# Altium footprint library ST封装.PcbLib: 1336 footprints (part 64 of 109)
Each footprint in its own frame and in the unit in brackets; x right, y up, seen from the top. Pads: shape width x height; smd on the part's side, far side on the other; paste and mask are expansions set on the pad; w line width, h text height; cw(c..) or ccw(c..) is an arc to the next point about the centre after c.
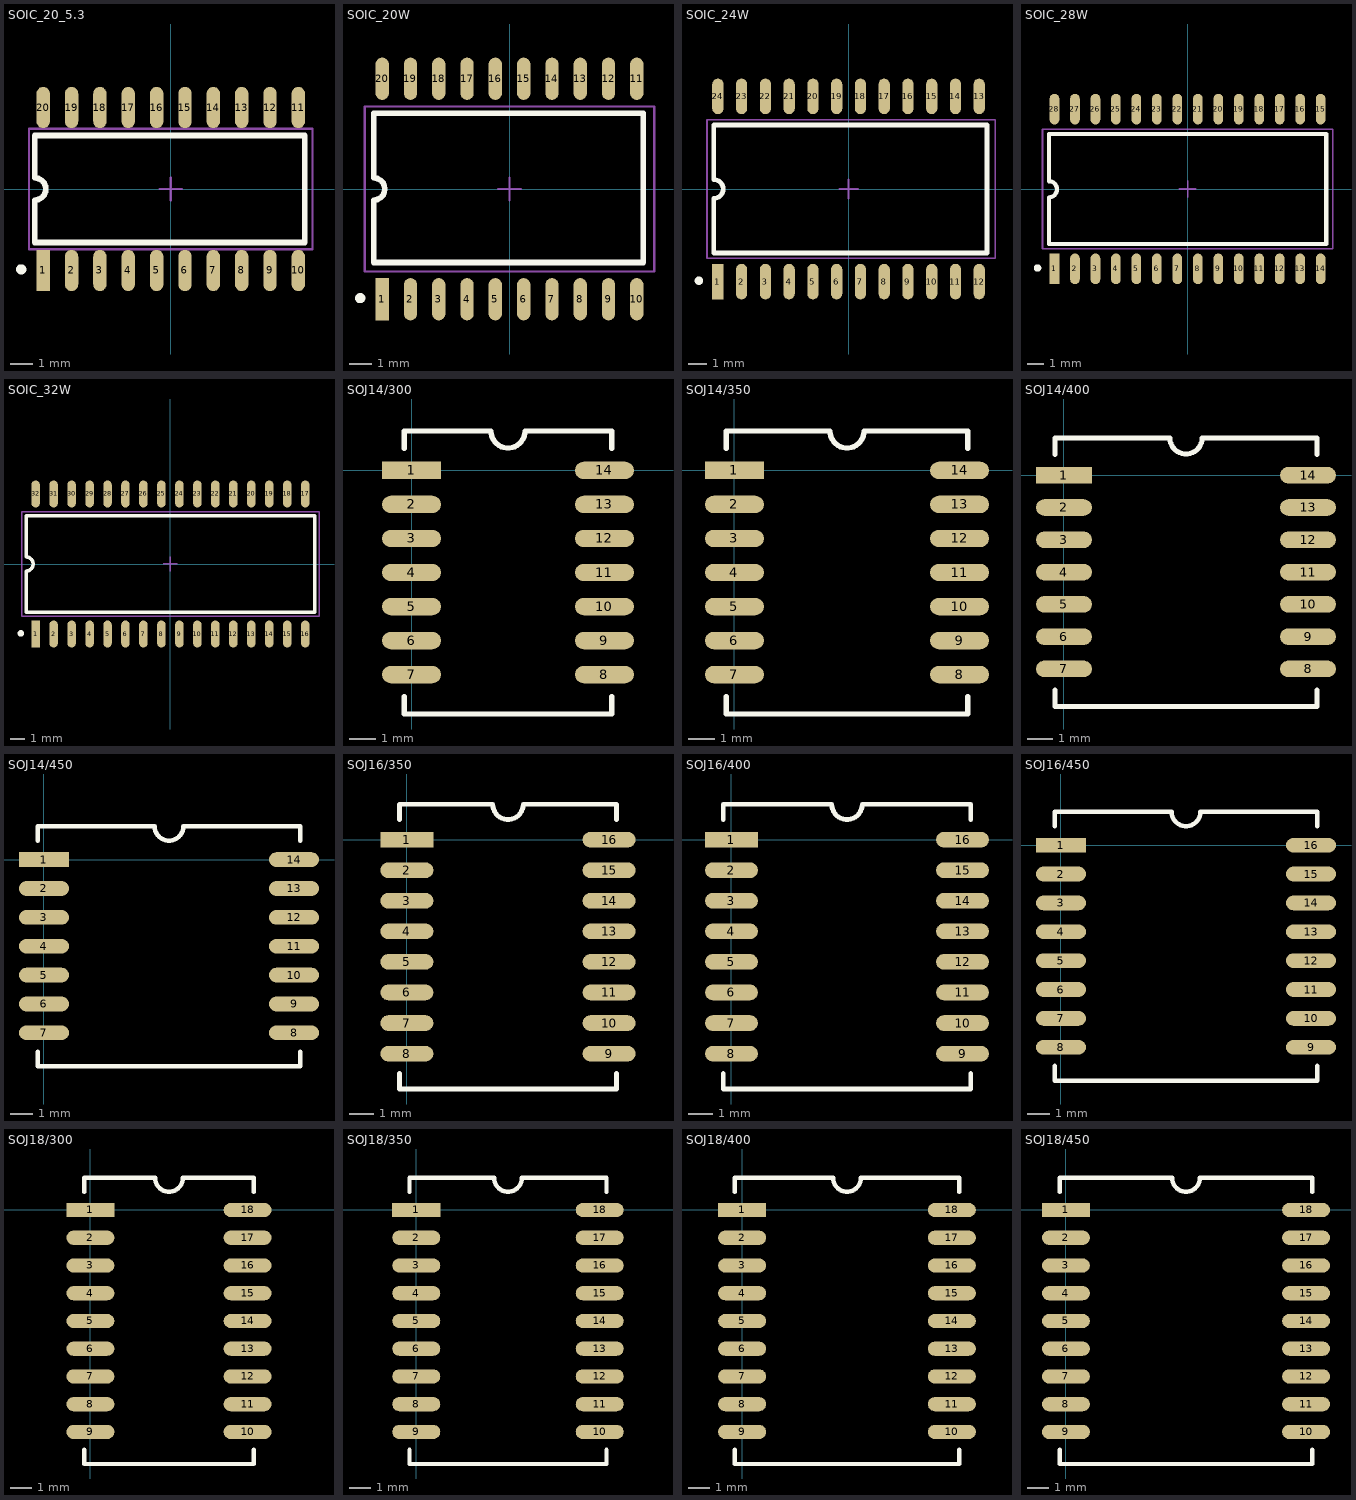
[diagram p63: the footprints below, top view; thin cyan lines are the x and y axes]

## SOIC_20_5.3 [mm]
pads (20):
  rect 0.6x1.85 smd: 1(-5.715,-3.65)
  oval 0.6x1.85 smd: 2(-4.445,-3.65) 3(-3.175,-3.65) 4(-1.905,-3.65) 5(-0.635,-3.65) 6(0.635,-3.65) 7(1.905,-3.65) 8(3.175,-3.65) 9(4.445,-3.65) 10(5.715,-3.65) 11(5.715,3.65) 12(4.445,3.65) 13(3.175,3.65) 14(1.905,3.65) 15(0.635,3.65) 16(-0.635,3.65) 17(-1.905,3.65) 18(-3.175,3.65) 19(-4.445,3.65) 20(-5.715,3.65)
Top Overlay:
  circle w0.254: c-6.7,-3.6 r0.1
  lines w0.254: -6.1,-2.4 -6.1,-0.5 ccw(c-6.1,0) -6.1,0.5 -6.1,2.4 6,2.4 6,-2.4 -6.1,-2.4
Mechanical 15:
  lines w0.1: -0.5,0 0.5,0 ; 0,-0.5 0,0.5 ; -6.35,-2.7 6.35,-2.7 6.35,2.7 -6.35,2.7 -6.35,-2.7
3D body "SOP-20.STEP": height 2, standoff 0, extent -6.35,-4.05 6.35,4.05

## SOIC_20W [mm] "7.4"
pads (20):
  rect 0.6x1.9 smd: 1(-5.715,-4.95)
  oval 0.6x1.9 smd: 2(-4.445,-4.95) 3(-3.175,-4.95) 4(-1.905,-4.95) 5(-0.635,-4.95) 6(0.635,-4.95) 7(1.905,-4.95) 8(3.175,-4.95) 9(4.445,-4.95) 10(5.715,-4.95) 11(5.715,4.95) 12(4.445,4.95) 13(3.175,4.95) 14(1.905,4.95) 15(0.635,4.95) 16(-0.635,4.95) 17(-1.905,4.95) 18(-3.175,4.95) 19(-4.445,4.95) 20(-5.715,4.95)
Top Overlay:
  circle w0.254: c-6.7,-4.9 r0.1
  lines w0.254: -6.1,-3.3 6,-3.3 6,3.4 -6.1,3.4 -6.1,0.5 cw(c-6.1,0) -6.1,-0.5 -6.1,-3.3
Mechanical 15:
  lines w0.1: -0.5,0 0.5,0 ; 0,-0.5 0,0.5 ; -6.5,-3.7 -6.5,3.7 6.5,3.7 6.5,-3.7 -6.5,-3.7
3D body "SOP-20L.STEP": height 2.8, standoff 0, extent -6.518,-5.152 6.482,5.184

## SOIC_24W [mm] "7.4"
pads (24):
  rect 0.6x1.9 smd: 1(-6.985,-4.95)
  oval 0.6x1.9 smd: 2(-5.715,-4.95) 3(-4.445,-4.95) 4(-3.175,-4.95) 5(-1.905,-4.95) 6(-0.635,-4.95) 7(0.635,-4.95) 8(1.905,-4.95) 9(3.175,-4.95) 10(4.445,-4.95) 11(5.715,-4.95) 12(6.985,-4.95) 13(6.985,4.95) 14(5.715,4.95) 15(4.445,4.95) 16(3.175,4.95) 17(1.905,4.95) 18(0.635,4.95) 19(-0.635,4.95) 20(-1.905,4.95) 21(-3.175,4.95) 22(-4.445,4.95) 23(-5.715,4.95) 24(-6.985,4.95)
Top Overlay:
  circle w0.254: c-8,-4.9 r0.1
  lines w0.254: -7.2,-3.425 7.4,-3.425 7.4,3.425 -7.2,3.425 -7.2,0.5 cw(c-7.2,0) -7.2,-0.5 -7.2,-3.425
Mechanical 15:
  lines w0.1: -0.5,0 0.5,0 ; 0,-0.5 0,0.5 ; -7.56,-3.7 7.84,-3.7 7.84,3.7 -7.56,3.7 -7.56,-3.7
3D body "SOIC24.STEP": height 2.6, standoff 0, extent -7.56,-5.2 7.84,5.2

## SOIC_28W [mm] "7.4"
pads (28):
  rect 0.6x1.9 smd: 1(-8.255,-4.95)
  oval 0.6x1.9 smd: 2(-6.985,-4.95) 3(-5.715,-4.95) 4(-4.445,-4.95) 5(-3.175,-4.95) 6(-1.905,-4.95) 7(-0.635,-4.95) 8(0.635,-4.95) 9(1.905,-4.95) 10(3.175,-4.95) 11(4.445,-4.95) 12(5.715,-4.95) 13(6.985,-4.95) 14(8.255,-4.95) 15(8.255,4.95) 16(6.985,4.95) 17(5.715,4.95) 18(4.445,4.95) 19(3.175,4.95) 20(1.905,4.95) 21(0.635,4.95) 22(-0.635,4.95) 23(-1.905,4.95) 24(-3.175,4.95) 25(-4.445,4.95) 26(-5.715,4.95) 27(-6.985,4.95) 28(-8.255,4.95)
Top Overlay:
  circle w0.254: c-9.3,-4.9 r0.1
  lines w0.254: -8.6,0.483 cw(c-8.6,-0.018) -8.6,-0.518 -8.6,-3.4 8.6,-3.4 8.6,3.4 -8.6,3.4 -8.6,0.5
Mechanical 15:
  lines w0.1: -0.5,0 0.5,0 ; 0,-0.5 0,0.5 ; -9,-3.7 -9,3.7 9,3.7 9,-3.7 -9,-3.7
3D body "SOIC28.STEP": height 2.65, standoff 0, extent -8.95,-5.15 8.95,5.15

## SOIC_32W [mm] "7.4"
pads (32):
  rect 0.6x1.9 smd: 1(-9.525,-4.95)
  oval 0.6x1.9 smd: 2(-8.255,-4.95) 3(-6.985,-4.95) 4(-5.715,-4.95) 5(-4.445,-4.95) 6(-3.175,-4.95) 7(-1.905,-4.95) 8(-0.635,-4.95) 9(0.635,-4.95) 10(1.905,-4.95) 11(3.175,-4.95) 12(4.445,-4.95) 13(5.715,-4.95) 14(6.985,-4.95) 15(8.255,-4.95) 16(9.525,-4.95) 17(9.525,4.95) 18(8.255,4.95) 19(6.985,4.95) 20(5.715,4.95) 21(4.445,4.95) 22(3.175,4.95) 23(1.905,4.95) 24(0.635,4.95) 25(-0.635,4.95) 26(-1.905,4.95) 27(-3.175,4.95) 28(-4.445,4.95) 29(-5.715,4.95) 30(-6.985,4.95) 31(-8.255,4.95) 32(-9.525,4.95)
Top Overlay:
  circle w0.254: c-10.57,-4.9 r0.1
  lines w0.254: -10.2,-3.4 -10.2,-0.501 ccw(c-10.2,0) -10.2,0.5 -10.2,3.4 10.2,3.4 10.2,-3.4 -10.2,-3.4
Mechanical 15:
  lines w0.1: -0.5,0 0.5,0 ; 0,-0.5 0,0.5 ; -10.5,-3.7 -10.5,3.7 10.5,3.7 10.5,-3.7 -10.5,-3.7

## SOJ14/300 [mm]
pads (14):
  rect 2.2x0.65 smd: 1(0,0)
  oval 2.2x0.65 smd: 2(0,-1.27) 3(0,-2.54) 4(0,-3.81) 5(0,-5.08) 6(0,-6.35) 7(0,-7.62) 8(7.2,-7.62) 9(7.2,-6.35) 10(7.2,-5.08) 11(7.2,-3.81) 12(7.2,-2.54) 13(7.2,-1.27) 14(7.2,0)
Top Overlay:
  lines w0.2: -0.275,-8.445 -0.275,-9.09 7.475,-9.09 7.475,-8.445 ; -0.275,0.825 -0.275,1.47 2.965,1.47 ccw(c3.6,1.47) 4.235,1.47 7.475,1.47 7.475,0.825

## SOJ14/350 [mm]
pads (14):
  rect 2.2x0.65 smd: 1(0,0)
  oval 2.2x0.65 smd: 2(0,-1.27) 3(0,-2.54) 4(0,-3.81) 5(0,-5.08) 6(0,-6.35) 7(0,-7.62) 8(8.4,-7.62) 9(8.4,-6.35) 10(8.4,-5.08) 11(8.4,-3.81) 12(8.4,-2.54) 13(8.4,-1.27) 14(8.4,0)
Top Overlay:
  lines w0.2: -0.31,-8.445 -0.31,-9.09 8.71,-9.09 8.71,-8.445 ; -0.31,0.825 -0.31,1.47 3.565,1.47 ccw(c4.2,1.47) 4.835,1.47 8.71,1.47 8.71,0.825

## SOJ14/400 [mm]
pads (14):
  rect 2.2x0.65 smd: 1(0,0)
  oval 2.2x0.65 smd: 2(0,-1.27) 3(0,-2.54) 4(0,-3.81) 5(0,-5.08) 6(0,-6.35) 7(0,-7.62) 8(9.6,-7.62) 9(9.6,-6.35) 10(9.6,-5.08) 11(9.6,-3.81) 12(9.6,-2.54) 13(9.6,-1.27) 14(9.6,0)
Top Overlay:
  lines w0.2: -0.345,-8.445 -0.345,-9.09 9.945,-9.09 9.945,-8.445 ; -0.345,0.825 -0.345,1.47 4.165,1.47 ccw(c4.8,1.47) 5.435,1.47 9.945,1.47 9.945,0.825

## SOJ14/450 [mm]
pads (14):
  rect 2.2x0.65 smd: 1(0,0)
  oval 2.2x0.65 smd: 2(0,-1.27) 3(0,-2.54) 4(0,-3.81) 5(0,-5.08) 6(0,-6.35) 7(0,-7.62) 8(11,-7.62) 9(11,-6.35) 10(11,-5.08) 11(11,-3.81) 12(11,-2.54) 13(11,-1.27) 14(11,0)
Top Overlay:
  lines w0.2: -0.28,-8.445 -0.28,-9.09 11.28,-9.09 11.28,-8.445 ; -0.28,0.825 -0.28,1.47 4.865,1.47 ccw(c5.5,1.47) 6.135,1.47 11.28,1.47 11.28,0.825

## SOJ16/350 [mm]
pads (16):
  rect 2.2x0.65 smd: 1(0,0)
  oval 2.2x0.65 smd: 2(0,-1.27) 3(0,-2.54) 4(0,-3.81) 5(0,-5.08) 6(0,-6.35) 7(0,-7.62) 8(0,-8.89) 9(8.4,-8.89) 10(8.4,-7.62) 11(8.4,-6.35) 12(8.4,-5.08) 13(8.4,-3.81) 14(8.4,-2.54) 15(8.4,-1.27) 16(8.4,0)
Top Overlay:
  lines w0.2: -0.31,-9.715 -0.31,-10.36 8.71,-10.36 8.71,-9.715 ; -0.31,0.825 -0.31,1.47 3.565,1.47 ccw(c4.2,1.47) 4.835,1.47 8.71,1.47 8.71,0.825

## SOJ16/400 [mm]
pads (16):
  rect 2.2x0.65 smd: 1(0,0)
  oval 2.2x0.65 smd: 2(0,-1.27) 3(0,-2.54) 4(0,-3.81) 5(0,-5.08) 6(0,-6.35) 7(0,-7.62) 8(0,-8.89) 9(9.6,-8.89) 10(9.6,-7.62) 11(9.6,-6.35) 12(9.6,-5.08) 13(9.6,-3.81) 14(9.6,-2.54) 15(9.6,-1.27) 16(9.6,0)
Top Overlay:
  lines w0.2: -0.345,-9.715 -0.345,-10.36 9.945,-10.36 9.945,-9.715 ; -0.345,0.825 -0.345,1.47 4.165,1.47 ccw(c4.8,1.47) 5.435,1.47 9.945,1.47 9.945,0.825

## SOJ16/450 [mm]
pads (16):
  rect 2.2x0.65 smd: 1(0,0)
  oval 2.2x0.65 smd: 2(0,-1.27) 3(0,-2.54) 4(0,-3.81) 5(0,-5.08) 6(0,-6.35) 7(0,-7.62) 8(0,-8.89) 9(11,-8.89) 10(11,-7.62) 11(11,-6.35) 12(11,-5.08) 13(11,-3.81) 14(11,-2.54) 15(11,-1.27) 16(11,0)
Top Overlay:
  lines w0.2: -0.28,-9.715 -0.28,-10.36 11.28,-10.36 11.28,-9.715 ; -0.28,0.825 -0.28,1.47 4.865,1.47 ccw(c5.5,1.47) 6.135,1.47 11.28,1.47 11.28,0.825

## SOJ18/300 [mm]
pads (18):
  rect 2.2x0.65 smd: 1(0,0)
  oval 2.2x0.65 smd: 2(0,-1.27) 3(0,-2.54) 4(0,-3.81) 5(0,-5.08) 6(0,-6.35) 7(0,-7.62) 8(0,-8.89) 9(0,-10.16) 10(7.2,-10.16) 11(7.2,-8.89) 12(7.2,-7.62) 13(7.2,-6.35) 14(7.2,-5.08) 15(7.2,-3.81) 16(7.2,-2.54) 17(7.2,-1.27) 18(7.2,0)
Top Overlay:
  lines w0.2: -0.275,-10.985 -0.275,-11.63 7.475,-11.63 7.475,-10.985 ; -0.275,0.825 -0.275,1.47 2.965,1.47 ccw(c3.6,1.47) 4.235,1.47 7.475,1.47 7.475,0.825

## SOJ18/350 [mm]
pads (18):
  rect 2.2x0.65 smd: 1(0,0)
  oval 2.2x0.65 smd: 2(0,-1.27) 3(0,-2.54) 4(0,-3.81) 5(0,-5.08) 6(0,-6.35) 7(0,-7.62) 8(0,-8.89) 9(0,-10.16) 10(8.4,-10.16) 11(8.4,-8.89) 12(8.4,-7.62) 13(8.4,-6.35) 14(8.4,-5.08) 15(8.4,-3.81) 16(8.4,-2.54) 17(8.4,-1.27) 18(8.4,0)
Top Overlay:
  lines w0.2: -0.31,-10.985 -0.31,-11.63 8.71,-11.63 8.71,-10.985 ; -0.31,0.825 -0.31,1.47 3.565,1.47 ccw(c4.2,1.47) 4.835,1.47 8.71,1.47 8.71,0.825

## SOJ18/400 [mm]
pads (18):
  rect 2.2x0.65 smd: 1(0,0)
  oval 2.2x0.65 smd: 2(0,-1.27) 3(0,-2.54) 4(0,-3.81) 5(0,-5.08) 6(0,-6.35) 7(0,-7.62) 8(0,-8.89) 9(0,-10.16) 10(9.6,-10.16) 11(9.6,-8.89) 12(9.6,-7.62) 13(9.6,-6.35) 14(9.6,-5.08) 15(9.6,-3.81) 16(9.6,-2.54) 17(9.6,-1.27) 18(9.6,0)
Top Overlay:
  lines w0.2: -0.345,-10.985 -0.345,-11.63 9.945,-11.63 9.945,-10.985 ; -0.345,0.825 -0.345,1.47 4.165,1.47 ccw(c4.8,1.47) 5.435,1.47 9.945,1.47 9.945,0.825

## SOJ18/450 [mm]
pads (18):
  rect 2.2x0.65 smd: 1(0,0)
  oval 2.2x0.65 smd: 2(0,-1.27) 3(0,-2.54) 4(0,-3.81) 5(0,-5.08) 6(0,-6.35) 7(0,-7.62) 8(0,-8.89) 9(0,-10.16) 10(11,-10.16) 11(11,-8.89) 12(11,-7.62) 13(11,-6.35) 14(11,-5.08) 15(11,-3.81) 16(11,-2.54) 17(11,-1.27) 18(11,0)
Top Overlay:
  lines w0.2: -0.28,-10.985 -0.28,-11.63 11.28,-11.63 11.28,-10.985 ; -0.28,0.825 -0.28,1.47 4.865,1.47 ccw(c5.5,1.47) 6.135,1.47 11.28,1.47 11.28,0.825